# Altium schematic symbol library Regulator_Linear.SchLib: 1452 symbols (part 5 of 10)
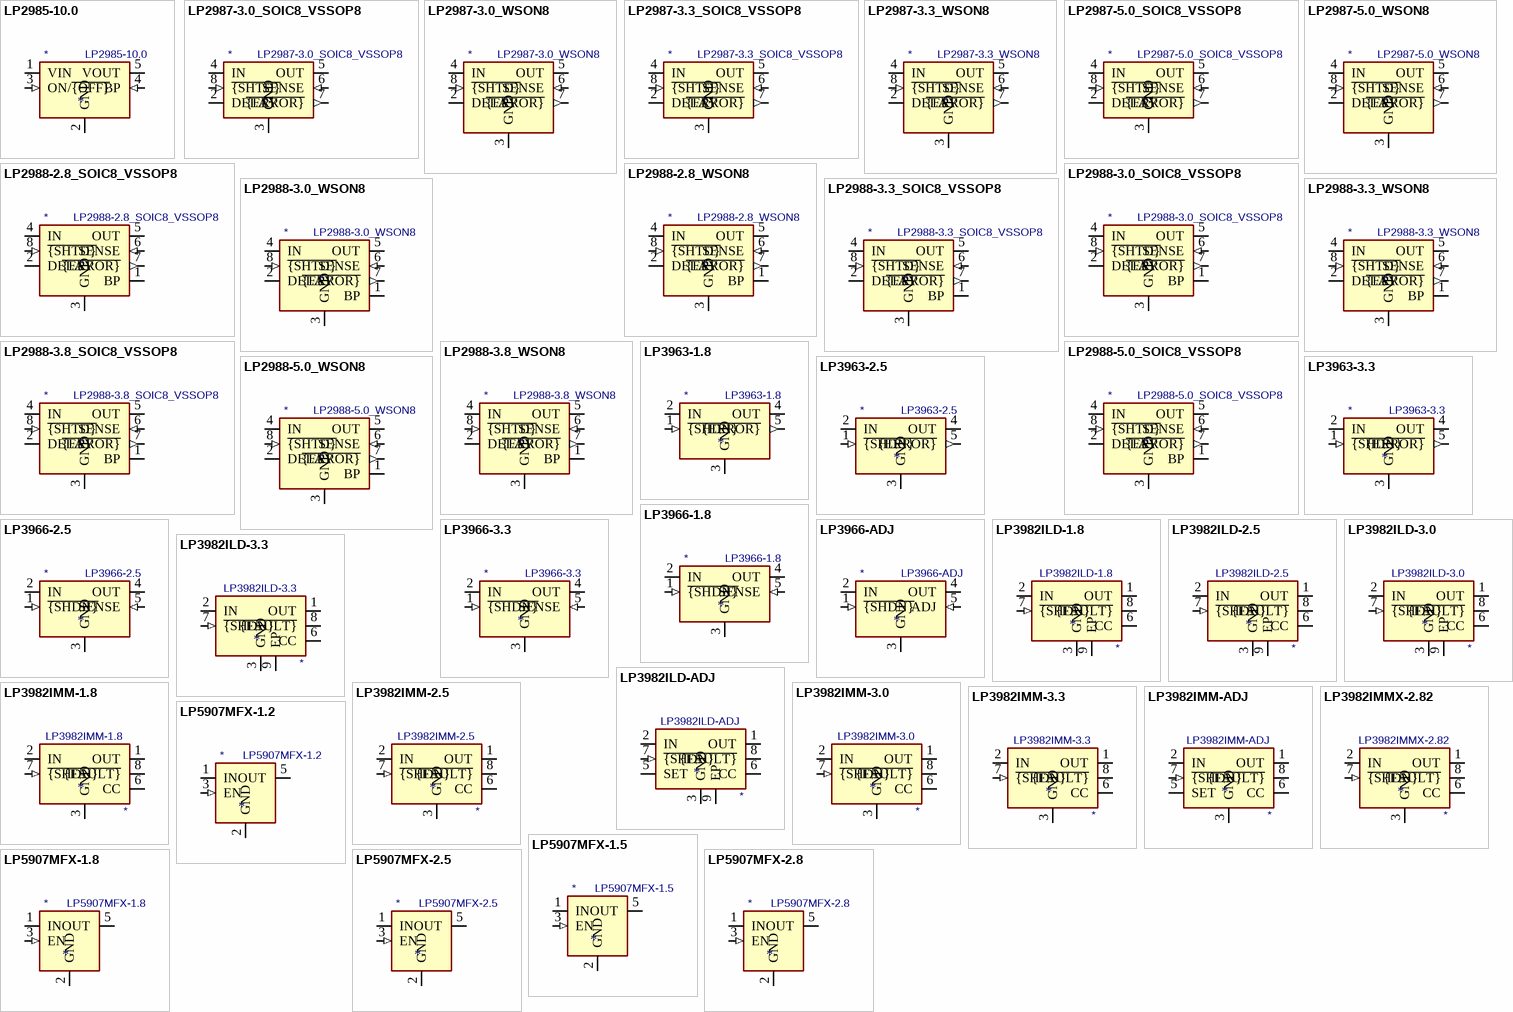
[diagram p40: symbols LP2985-10.0 to LP5907MFX-2.8]

## LP3982IMM-1.8
designator *  value LP3982IMM-1.8
ki_keywords: linear regulator; ki_description: 1.8V, 300mA, Micropower, Ultra-Low-Dropout, Low-Noise CMOS Regulator, VSSOP-8; ki_fp_filters: VSSOP*3.0x3.0mm*P0.65mm*; Footprint: Package_SO:VSSOP-8_3.0x3.0mm_P0.65mm; Supplier: http://www.ti.com/lit/ds/symlink/lp3982.pdf
footprint VSSOP-8_3.0x3.0mm_P0.65mm
pins: 1 OUT (power), 2 IN (power), 3 GND (power), 4 OUT hidden, 5 NC (in) hidden, 6 CC, 7 ~{{SHDN}} (in), 8 ~{{FAULT}} (oc)

## LP3982IMM-2.5
designator *  value LP3982IMM-2.5
ki_keywords: linear regulator; ki_description: 2.5V, 300mA, Micropower, Ultra-Low-Dropout, Low-Noise CMOS Regulator, VSSOP-8; ki_fp_filters: VSSOP*3.0x3.0mm*P0.65mm*; Footprint: Package_SO:VSSOP-8_3.0x3.0mm_P0.65mm; Supplier: http://www.ti.com/lit/ds/symlink/lp3982.pdf
footprint VSSOP-8_3.0x3.0mm_P0.65mm
pins: 1 OUT (power), 2 IN (power), 3 GND (power), 4 OUT hidden, 5 NC (in) hidden, 6 CC, 7 ~{{SHDN}} (in), 8 ~{{FAULT}} (oc)

## LP3982IMM-3.0
designator *  value LP3982IMM-3.0
ki_keywords: linear regulator; ki_description: 3.0V, 300mA, Micropower, Ultra-Low-Dropout, Low-Noise CMOS Regulator, VSSOP-8; ki_fp_filters: VSSOP*3.0x3.0mm*P0.65mm*; Footprint: Package_SO:VSSOP-8_3.0x3.0mm_P0.65mm; Supplier: http://www.ti.com/lit/ds/symlink/lp3982.pdf
footprint VSSOP-8_3.0x3.0mm_P0.65mm
pins: 1 OUT (power), 2 IN (power), 3 GND (power), 4 OUT hidden, 5 NC (in) hidden, 6 CC, 7 ~{{SHDN}} (in), 8 ~{{FAULT}} (oc)

## LP3982IMM-3.3
designator *  value LP3982IMM-3.3
ki_keywords: linear regulator; ki_description: 3.3V, 300mA, Micropower, Ultra-Low-Dropout, Low-Noise CMOS Regulator, VSSOP-8; ki_fp_filters: VSSOP*3.0x3.0mm*P0.65mm*; Footprint: Package_SO:VSSOP-8_3.0x3.0mm_P0.65mm; Supplier: http://www.ti.com/lit/ds/symlink/lp3982.pdf
footprint VSSOP-8_3.0x3.0mm_P0.65mm
pins: 1 OUT (power), 2 IN (power), 3 GND (power), 4 OUT hidden, 5 NC (in) hidden, 6 CC, 7 ~{{SHDN}} (in), 8 ~{{FAULT}} (oc)

## LP3982IMM-ADJ
designator *  value LP3982IMM-ADJ
ki_keywords: adjustable linear regulator; ki_description: 300mA, Micropower, Ultra-Low-Dropout, Low-Noise Adjustable CMOS Regulator, VSSOP-8; ki_fp_filters: VSSOP*3.0x3.0mm*P0.65mm*; Footprint: Package_SO:VSSOP-8_3.0x3.0mm_P0.65mm; Supplier: http://www.ti.com/lit/ds/symlink/lp3982.pdf
footprint VSSOP-8_3.0x3.0mm_P0.65mm
pins: 1 OUT (power), 2 IN (power), 3 GND (power), 4 OUT hidden, 5 SET, 6 CC, 7 ~{{SHDN}} (in), 8 ~{{FAULT}} (oc)

## LP3982IMMX-2.82
designator *  value LP3982IMMX-2.82
ki_keywords: linear regulator; ki_description: 2.82V, 300mA, Micropower, Ultra-Low-Dropout, Low-Noise CMOS Regulator, VSSOP-8; ki_fp_filters: VSSOP*3.0x3.0mm*P0.65mm*; Footprint: Package_SO:VSSOP-8_3.0x3.0mm_P0.65mm; Supplier: http://www.ti.com/lit/ds/symlink/lp3982.pdf
footprint VSSOP-8_3.0x3.0mm_P0.65mm
pins: 1 OUT (power), 2 IN (power), 3 GND (power), 4 OUT hidden, 5 NC (in) hidden, 6 CC, 7 ~{{SHDN}} (in), 8 ~{{FAULT}} (oc)

## LP5907MFX-1.2
designator *  value LP5907MFX-1.2
ki_keywords: Single Output LDO Low-Noise; ki_description: 250-mA Ultra-Low-Noise Low-IQ LDO, 1.2V, SOT-23; ki_fp_filters: SOT?23*; Footprint: Package_TO_SOT_SMD:SOT-23-5; Supplier: http://www.ti.com/lit/ds/symlink/lp5907.pdf
footprint SOT-23-5
pins: 1 IN (power), 2 GND (power), 3 EN (in), 4 NC (in) hidden, 5 OUT (power)

## LP5907MFX-1.5
designator *  value LP5907MFX-1.5
ki_keywords: Single Output LDO Low-Noise; ki_description: 250-mA Ultra-Low-Noise Low-IQ LDO, 1.5V, SOT-23; ki_fp_filters: SOT?23*; Footprint: Package_TO_SOT_SMD:SOT-23-5; Supplier: http://www.ti.com/lit/ds/symlink/lp5907.pdf
footprint SOT-23-5
pins: 1 IN (power), 2 GND (power), 3 EN (in), 4 NC (in) hidden, 5 OUT (power)

## LP5907MFX-1.8
designator *  value LP5907MFX-1.8
ki_keywords: Single Output LDO Low-Noise; ki_description: 250-mA Ultra-Low-Noise Low-IQ LDO, 1.8V, SOT-23; ki_fp_filters: SOT?23*; Footprint: Package_TO_SOT_SMD:SOT-23-5; Supplier: http://www.ti.com/lit/ds/symlink/lp5907.pdf
footprint SOT-23-5
pins: 1 IN (power), 2 GND (power), 3 EN (in), 4 NC (in) hidden, 5 OUT (power)

## LP5907MFX-2.5
designator *  value LP5907MFX-2.5
ki_keywords: Single Output LDO Low-Noise; ki_description: 250-mA Ultra-Low-Noise Low-IQ LDO, 2.5V, SOT-23; ki_fp_filters: SOT?23*; Footprint: Package_TO_SOT_SMD:SOT-23-5; Supplier: http://www.ti.com/lit/ds/symlink/lp5907.pdf
footprint SOT-23-5
pins: 1 IN (power), 2 GND (power), 3 EN (in), 4 NC (in) hidden, 5 OUT (power)

## LP5907MFX-2.8
designator *  value LP5907MFX-2.8
ki_keywords: Single Output LDO Low-Noise; ki_description: 250-mA Ultra-Low-Noise Low-IQ LDO, 2.8V, SOT-23; ki_fp_filters: SOT?23*; Footprint: Package_TO_SOT_SMD:SOT-23-5; Supplier: http://www.ti.com/lit/ds/symlink/lp5907.pdf
footprint SOT-23-5
pins: 1 IN (power), 2 GND (power), 3 EN (in), 4 NC (in) hidden, 5 OUT (power)

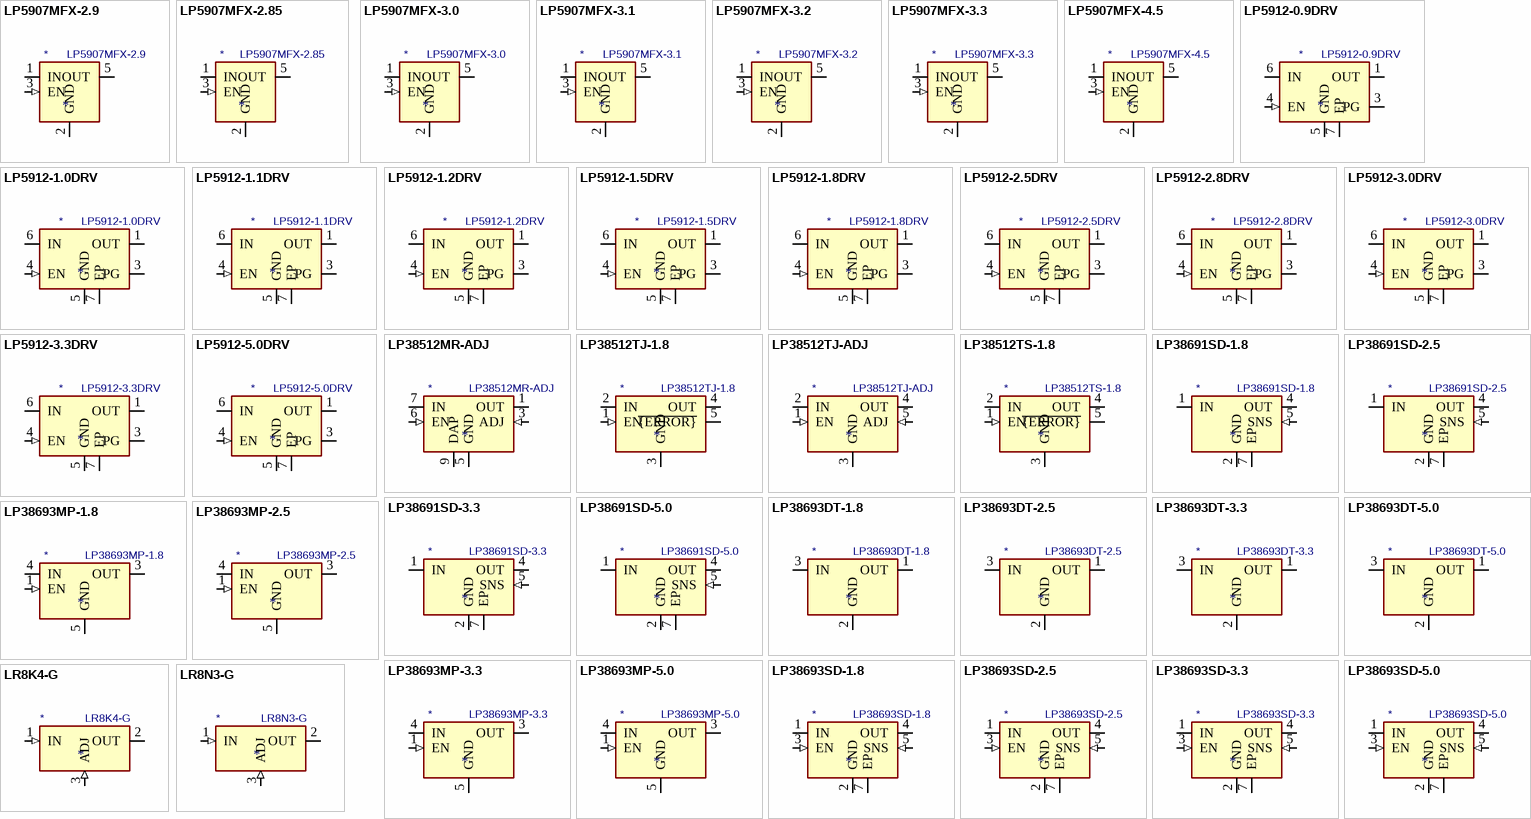
[diagram p16: symbols LP5907MFX-2.9 to LR8N3-G]

## LP5907MFX-2.9
designator *  value LP5907MFX-2.9
ki_keywords: Single Output LDO Low-Noise; ki_description: 250-mA Ultra-Low-Noise Low-IQ LDO, 2.9V, SOT-23; ki_fp_filters: SOT?23*; Footprint: Package_TO_SOT_SMD:SOT-23-5; Supplier: http://www.ti.com/lit/ds/symlink/lp5907.pdf
footprint SOT-23-5
pins: 1 IN (power), 2 GND (power), 3 EN (in), 4 NC (in) hidden, 5 OUT (power)

## LP5907MFX-2.85
designator *  value LP5907MFX-2.85
ki_keywords: Single Output LDO Low-Noise; ki_description: 250-mA Ultra-Low-Noise Low-IQ LDO, 2.85V, SOT-23; ki_fp_filters: SOT?23*; Footprint: Package_TO_SOT_SMD:SOT-23-5; Supplier: http://www.ti.com/lit/ds/symlink/lp5907.pdf
footprint SOT-23-5
pins: 1 IN (power), 2 GND (power), 3 EN (in), 4 NC (in) hidden, 5 OUT (power)

## LP5907MFX-3.0
designator *  value LP5907MFX-3.0
ki_keywords: Single Output LDO Low-Noise; ki_description: 250-mA Ultra-Low-Noise Low-IQ LDO, 3.0V, SOT-23; ki_fp_filters: SOT?23*; Footprint: Package_TO_SOT_SMD:SOT-23-5; Supplier: http://www.ti.com/lit/ds/symlink/lp5907.pdf
footprint SOT-23-5
pins: 1 IN (power), 2 GND (power), 3 EN (in), 4 NC (in) hidden, 5 OUT (power)

## LP5907MFX-3.1
designator *  value LP5907MFX-3.1
ki_keywords: Single Output LDO Low-Noise; ki_description: 250-mA Ultra-Low-Noise Low-IQ LDO, 3.1V, SOT-23; ki_fp_filters: SOT?23*; Footprint: Package_TO_SOT_SMD:SOT-23-5; Supplier: http://www.ti.com/lit/ds/symlink/lp5907.pdf
footprint SOT-23-5
pins: 1 IN (power), 2 GND (power), 3 EN (in), 4 NC (in) hidden, 5 OUT (power)

## LP5907MFX-3.2
designator *  value LP5907MFX-3.2
ki_keywords: Single Output LDO Low-Noise; ki_description: 250-mA Ultra-Low-Noise Low-IQ LDO, 3.2V, SOT-23; ki_fp_filters: SOT?23*; Footprint: Package_TO_SOT_SMD:SOT-23-5; Supplier: http://www.ti.com/lit/ds/symlink/lp5907.pdf
footprint SOT-23-5
pins: 1 IN (power), 2 GND (power), 3 EN (in), 4 NC (in) hidden, 5 OUT (power)

## LP5907MFX-3.3
designator *  value LP5907MFX-3.3
ki_keywords: Single Output LDO Low-Noise; ki_description: 250-mA Ultra-Low-Noise Low-IQ LDO, 3.3V, SOT-23; ki_fp_filters: SOT?23*; Footprint: Package_TO_SOT_SMD:SOT-23-5; Supplier: http://www.ti.com/lit/ds/symlink/lp5907.pdf
footprint SOT-23-5
pins: 1 IN (power), 2 GND (power), 3 EN (in), 4 NC (in) hidden, 5 OUT (power)

## LP5907MFX-4.5
designator *  value LP5907MFX-4.5
ki_keywords: Single Output LDO Low-Noise; ki_description: 250-mA Ultra-Low-Noise Low-IQ LDO, 4.5V, SOT-23; ki_fp_filters: SOT?23*; Footprint: Package_TO_SOT_SMD:SOT-23-5; Supplier: http://www.ti.com/lit/ds/symlink/lp5907.pdf
footprint SOT-23-5
pins: 1 IN (power), 2 GND (power), 3 EN (in), 4 NC (in) hidden, 5 OUT (power)

## LP5912-0.9DRV
designator *  value LP5912-0.9DRV
ki_keywords: Single Output LDO Low-Noise; ki_description: 500-mA Ultra-Low-Noise Low-IQ LDO, 0.9V, WSON-6; ki_fp_filters: WSON*1EP*2x2mm*P0.65mm*; Footprint: Package_SON:WSON-6-1EP_2x2mm_P0.65mm_EP1x1.6mm_ThermalVias; Supplier: http://www.ti.com/lit/ds/symlink/lp5912.pdf
footprint WSON-6-1EP_2x2mm_P0.65mm_EP1x1.6mm_ThermalVias
pins: 1 OUT (power), 2 NC (in) hidden, 3 PG (oc), 4 EN (in), 5 GND (power), 6 IN (power), 7 EP

## LP5912-1.0DRV
designator *  value LP5912-1.0DRV
ki_keywords: Single Output LDO Low-Noise; ki_description: 500-mA Ultra-Low-Noise Low-IQ LDO, 1.0V, WSON-6; ki_fp_filters: WSON*1EP*2x2mm*P0.65mm*; Footprint: Package_SON:WSON-6-1EP_2x2mm_P0.65mm_EP1x1.6mm_ThermalVias; Supplier: http://www.ti.com/lit/ds/symlink/lp5912.pdf
footprint WSON-6-1EP_2x2mm_P0.65mm_EP1x1.6mm_ThermalVias
pins: 1 OUT (power), 2 NC (in) hidden, 3 PG (oc), 4 EN (in), 5 GND (power), 6 IN (power), 7 EP

## LP5912-1.1DRV
designator *  value LP5912-1.1DRV
ki_keywords: Single Output LDO Low-Noise; ki_description: 500-mA Ultra-Low-Noise Low-IQ LDO, 1.1V, WSON-6; ki_fp_filters: WSON*1EP*2x2mm*P0.65mm*; Footprint: Package_SON:WSON-6-1EP_2x2mm_P0.65mm_EP1x1.6mm_ThermalVias; Supplier: http://www.ti.com/lit/ds/symlink/lp5912.pdf
footprint WSON-6-1EP_2x2mm_P0.65mm_EP1x1.6mm_ThermalVias
pins: 1 OUT (power), 2 NC (in) hidden, 3 PG (oc), 4 EN (in), 5 GND (power), 6 IN (power), 7 EP

## LP5912-1.2DRV
designator *  value LP5912-1.2DRV
ki_keywords: Single Output LDO Low-Noise; ki_description: 500-mA Ultra-Low-Noise Low-IQ LDO, 1.2V, WSON-6; ki_fp_filters: WSON*1EP*2x2mm*P0.65mm*; Footprint: Package_SON:WSON-6-1EP_2x2mm_P0.65mm_EP1x1.6mm_ThermalVias; Supplier: http://www.ti.com/lit/ds/symlink/lp5912.pdf
footprint WSON-6-1EP_2x2mm_P0.65mm_EP1x1.6mm_ThermalVias
pins: 1 OUT (power), 2 NC (in) hidden, 3 PG (oc), 4 EN (in), 5 GND (power), 6 IN (power), 7 EP

## LP5912-1.5DRV
designator *  value LP5912-1.5DRV
ki_keywords: Single Output LDO Low-Noise; ki_description: 500-mA Ultra-Low-Noise Low-IQ LDO, 1.5V, WSON-6; ki_fp_filters: WSON*1EP*2x2mm*P0.65mm*; Footprint: Package_SON:WSON-6-1EP_2x2mm_P0.65mm_EP1x1.6mm_ThermalVias; Supplier: http://www.ti.com/lit/ds/symlink/lp5912.pdf
footprint WSON-6-1EP_2x2mm_P0.65mm_EP1x1.6mm_ThermalVias
pins: 1 OUT (power), 2 NC (in) hidden, 3 PG (oc), 4 EN (in), 5 GND (power), 6 IN (power), 7 EP

## LP5912-1.8DRV
designator *  value LP5912-1.8DRV
ki_keywords: Single Output LDO Low-Noise; ki_description: 500-mA Ultra-Low-Noise Low-IQ LDO, 1.8V, WSON-6; ki_fp_filters: WSON*1EP*2x2mm*P0.65mm*; Footprint: Package_SON:WSON-6-1EP_2x2mm_P0.65mm_EP1x1.6mm_ThermalVias; Supplier: http://www.ti.com/lit/ds/symlink/lp5912.pdf
footprint WSON-6-1EP_2x2mm_P0.65mm_EP1x1.6mm_ThermalVias
pins: 1 OUT (power), 2 NC (in) hidden, 3 PG (oc), 4 EN (in), 5 GND (power), 6 IN (power), 7 EP

## LP5912-2.5DRV
designator *  value LP5912-2.5DRV
ki_keywords: Single Output LDO Low-Noise; ki_description: 500-mA Ultra-Low-Noise Low-IQ LDO, 2.5V, WSON-6; ki_fp_filters: WSON*1EP*2x2mm*P0.65mm*; Footprint: Package_SON:WSON-6-1EP_2x2mm_P0.65mm_EP1x1.6mm_ThermalVias; Supplier: http://www.ti.com/lit/ds/symlink/lp5912.pdf
footprint WSON-6-1EP_2x2mm_P0.65mm_EP1x1.6mm_ThermalVias
pins: 1 OUT (power), 2 NC (in) hidden, 3 PG (oc), 4 EN (in), 5 GND (power), 6 IN (power), 7 EP

## LP5912-2.8DRV
designator *  value LP5912-2.8DRV
ki_keywords: Single Output LDO Low-Noise; ki_description: 500-mA Ultra-Low-Noise Low-IQ LDO, 2.8V, WSON-6; ki_fp_filters: WSON*1EP*2x2mm*P0.65mm*; Footprint: Package_SON:WSON-6-1EP_2x2mm_P0.65mm_EP1x1.6mm_ThermalVias; Supplier: http://www.ti.com/lit/ds/symlink/lp5912.pdf
footprint WSON-6-1EP_2x2mm_P0.65mm_EP1x1.6mm_ThermalVias
pins: 1 OUT (power), 2 NC (in) hidden, 3 PG (oc), 4 EN (in), 5 GND (power), 6 IN (power), 7 EP

## LP5912-3.0DRV
designator *  value LP5912-3.0DRV
ki_keywords: Single Output LDO Low-Noise; ki_description: 500-mA Ultra-Low-Noise Low-IQ LDO, 3.0V, WSON-6; ki_fp_filters: WSON*1EP*2x2mm*P0.65mm*; Footprint: Package_SON:WSON-6-1EP_2x2mm_P0.65mm_EP1x1.6mm_ThermalVias; Supplier: http://www.ti.com/lit/ds/symlink/lp5912.pdf
footprint WSON-6-1EP_2x2mm_P0.65mm_EP1x1.6mm_ThermalVias
pins: 1 OUT (power), 2 NC (in) hidden, 3 PG (oc), 4 EN (in), 5 GND (power), 6 IN (power), 7 EP

## LP5912-3.3DRV
designator *  value LP5912-3.3DRV
ki_keywords: Single Output LDO Low-Noise; ki_description: 500-mA Ultra-Low-Noise Low-IQ LDO, 3.3V, WSON-6; ki_fp_filters: WSON*1EP*2x2mm*P0.65mm*; Footprint: Package_SON:WSON-6-1EP_2x2mm_P0.65mm_EP1x1.6mm_ThermalVias; Supplier: http://www.ti.com/lit/ds/symlink/lp5912.pdf
footprint WSON-6-1EP_2x2mm_P0.65mm_EP1x1.6mm_ThermalVias
pins: 1 OUT (power), 2 NC (in) hidden, 3 PG (oc), 4 EN (in), 5 GND (power), 6 IN (power), 7 EP

## LP5912-5.0DRV
designator *  value LP5912-5.0DRV
ki_keywords: Single Output LDO Low-Noise; ki_description: 500-mA Ultra-Low-Noise Low-IQ LDO, 5.0V, WSON-6; ki_fp_filters: WSON*1EP*2x2mm*P0.65mm*; Footprint: Package_SON:WSON-6-1EP_2x2mm_P0.65mm_EP1x1.6mm_ThermalVias; Supplier: http://www.ti.com/lit/ds/symlink/lp5912.pdf
footprint WSON-6-1EP_2x2mm_P0.65mm_EP1x1.6mm_ThermalVias
pins: 1 OUT (power), 2 NC (in) hidden, 3 PG (oc), 4 EN (in), 5 GND (power), 6 IN (power), 7 EP

## LP38512MR-ADJ
designator *  value LP38512MR-ADJ
ki_keywords: LDO Linear Regulator; ki_description: 1.5A Fast-Transient Response Low-Dropout Linear Voltage Regulator with Error Flag, Adjustable Output, HTSOP-8; ki_fp_filters: Texas*HTSOP*1EP*3.9x4.9mm*P1.27mm*; Footprint: Package_SO:Texas_HTSOP-8-1EP_3.9x4.9mm_P1.27mm_EP2.95x4.9mm_Mask2.4x3.1mm_ThermalVias; Supplier: http://www.ti.com/lit/ds/symlink/lp38512-adj.pdf
footprint Texas_HTSOP-8-1EP_3.9x4.9mm_P1.27mm_EP2.95x4.9mm_Mask2.4x3.1mm_ThermalVias
pins: 1 OUT (power), 2 OUT hidden, 3 ADJ (in), 4 NC (in) hidden, 5 GND (power), 6 EN (in), 7 IN (power), 8 IN hidden, 9 DAP

## LP38512TJ-1.8
designator *  value LP38512TJ-1.8
ki_keywords: LDO Linear Regulator; ki_description: 1.5A Fast-Transient Response Low-Dropout Linear Voltage Regulator with Error Flag, 1.8V Output, NDQ; ki_fp_filters: Texas*NDQ*; Footprint: Package_TO_SOT_SMD:Texas_NDQ; Supplier: http://www.ti.com/lit/ds/symlink/lp38512.pdf
footprint Texas_NDQ
pins: 1 EN (in), 2 IN (power), 3 GND (power), 4 OUT (power), 5 ~{{ERROR}} (oc), 6 GND hidden

## LP38512TJ-ADJ
designator *  value LP38512TJ-ADJ
ki_keywords: LDO Linear Regulator; ki_description: 1.5A Fast-Transient Response Low-Dropout Linear Voltage Regulator with Error Flag, Adjustable Output, NDQ; ki_fp_filters: Texas*NDQ*; Footprint: Package_TO_SOT_SMD:Texas_NDQ; Supplier: http://www.ti.com/lit/ds/symlink/lp38512-adj.pdf
footprint Texas_NDQ
pins: 1 EN (in), 2 IN (power), 3 GND (power), 4 OUT (power), 5 ADJ (in), 6 GND hidden

## LP38512TS-1.8
designator *  value LP38512TS-1.8
ki_keywords: LDO Linear Regulator DDPAK D2PAK; ki_description: 1.5A Fast-Transient Response Low-Dropout Linear Voltage Regulator with Error Flag, 1.8V Output, TO-263; ki_fp_filters: TO*263*TabPin6*; Footprint: Package_TO_SOT_SMD:TO-263-5_TabPin6; Supplier: http://www.ti.com/lit/ds/symlink/lp38512.pdf
footprint TO-263-5_TabPin6
pins: 1 EN (in), 2 IN (power), 3 GND (power), 4 OUT (power), 5 ~{{ERROR}} (oc), 6 GND hidden

## LP38691SD-1.8
designator *  value LP38691SD-1.8
ki_keywords: LDO Linear Regulator; ki_description: 500-mA Low-Dropout CMOS Linear Regulators Stable With Ceramic Output Capacitors, 1.8V output voltage, WSON-6; ki_fp_filters: WSON*1EP*3x3mm*P0.95mm*; Footprint: Package_SON:WSON-6-1EP_3x3mm_P0.95mm; Supplier: https://www.ti.com/lit/ds/symlink/lp38691.pdf
footprint WSON-6-1EP_3x3mm_P0.95mm
pins: 1 IN (power), 2 GND (power), 3 NC (in) hidden, 4 OUT (power), 5 SNS (in), 6 IN hidden, 7 EP

## LP38691SD-2.5
designator *  value LP38691SD-2.5
ki_keywords: LDO Linear Regulator; ki_description: 500-mA Low-Dropout CMOS Linear Regulators Stable With Ceramic Output Capacitors, 2.5V output voltage, WSON-6; ki_fp_filters: WSON*1EP*3x3mm*P0.95mm*; Footprint: Package_SON:WSON-6-1EP_3x3mm_P0.95mm; Supplier: https://www.ti.com/lit/ds/symlink/lp38691.pdf
footprint WSON-6-1EP_3x3mm_P0.95mm
pins: 1 IN (power), 2 GND (power), 3 NC (in) hidden, 4 OUT (power), 5 SNS (in), 6 IN hidden, 7 EP

## LP38691SD-3.3
designator *  value LP38691SD-3.3
ki_keywords: LDO Linear Regulator; ki_description: 500-mA Low-Dropout CMOS Linear Regulators Stable With Ceramic Output Capacitors, 3.3V output voltage, WSON-6; ki_fp_filters: WSON*1EP*3x3mm*P0.95mm*; Footprint: Package_SON:WSON-6-1EP_3x3mm_P0.95mm; Supplier: https://www.ti.com/lit/ds/symlink/lp38691.pdf
footprint WSON-6-1EP_3x3mm_P0.95mm
pins: 1 IN (power), 2 GND (power), 3 NC (in) hidden, 4 OUT (power), 5 SNS (in), 6 IN hidden, 7 EP

## LP38691SD-5.0
designator *  value LP38691SD-5.0
ki_keywords: LDO Linear Regulator; ki_description: 500-mA Low-Dropout CMOS Linear Regulators Stable With Ceramic Output Capacitors, 5.0V output voltage, WSON-6; ki_fp_filters: WSON*1EP*3x3mm*P0.95mm*; Footprint: Package_SON:WSON-6-1EP_3x3mm_P0.95mm; Supplier: https://www.ti.com/lit/ds/symlink/lp38691.pdf
footprint WSON-6-1EP_3x3mm_P0.95mm
pins: 1 IN (power), 2 GND (power), 3 NC (in) hidden, 4 OUT (power), 5 SNS (in), 6 IN hidden, 7 EP

## LP38693DT-1.8
designator *  value LP38693DT-1.8
ki_keywords: LDO Linear Regulator; ki_description: 500-mA Low-Dropout CMOS Linear Regulators Stable With Ceramic Output Capacitors, 1.8V output voltage, TO-252; ki_fp_filters: TO*252*; Footprint: Package_TO_SOT_SMD:TO-252-2; Supplier: https://www.ti.com/lit/ds/symlink/lp38693.pdf
footprint TO-252-2
pins: 1 OUT (power), 2 GND (power), 3 IN (power)

## LP38693DT-2.5
designator *  value LP38693DT-2.5
ki_keywords: LDO Linear Regulator; ki_description: 500-mA Low-Dropout CMOS Linear Regulators Stable With Ceramic Output Capacitors, 2.5V output voltage, TO-252; ki_fp_filters: TO*252*; Footprint: Package_TO_SOT_SMD:TO-252-2; Supplier: https://www.ti.com/lit/ds/symlink/lp38693.pdf
footprint TO-252-2
pins: 1 OUT (power), 2 GND (power), 3 IN (power)

## LP38693DT-3.3
designator *  value LP38693DT-3.3
ki_keywords: LDO Linear Regulator; ki_description: 500-mA Low-Dropout CMOS Linear Regulators Stable With Ceramic Output Capacitors, 3.3V output voltage, TO-252; ki_fp_filters: TO*252*; Footprint: Package_TO_SOT_SMD:TO-252-2; Supplier: https://www.ti.com/lit/ds/symlink/lp38693.pdf
footprint TO-252-2
pins: 1 OUT (power), 2 GND (power), 3 IN (power)

## LP38693DT-5.0
designator *  value LP38693DT-5.0
ki_keywords: LDO Linear Regulator; ki_description: 500-mA Low-Dropout CMOS Linear Regulators Stable With Ceramic Output Capacitors, 5.0V output voltage, TO-252; ki_fp_filters: TO*252*; Footprint: Package_TO_SOT_SMD:TO-252-2; Supplier: https://www.ti.com/lit/ds/symlink/lp38693.pdf
footprint TO-252-2
pins: 1 OUT (power), 2 GND (power), 3 IN (power)

## LP38693MP-1.8
designator *  value LP38693MP-1.8
ki_keywords: LDO Linear Regulator; ki_description: 500-mA Low-Dropout CMOS Linear Regulators Stable With Ceramic Output Capacitors, 1.8V output voltage, Enable Pin, SOT-223; ki_fp_filters: SOT*223*; Footprint: Package_TO_SOT_SMD:SOT-223-5; Supplier: https://www.ti.com/lit/ds/symlink/lp38693.pdf
footprint SOT-223-5
pins: 1 EN (in), 2 NC (in) hidden, 3 OUT (power), 4 IN (power), 5 GND (power)

## LP38693MP-2.5
designator *  value LP38693MP-2.5
ki_keywords: LDO Linear Regulator; ki_description: 500-mA Low-Dropout CMOS Linear Regulators Stable With Ceramic Output Capacitors, 2.5V output voltage, Enable Pin, SOT-223; ki_fp_filters: SOT*223*; Footprint: Package_TO_SOT_SMD:SOT-223-5; Supplier: https://www.ti.com/lit/ds/symlink/lp38693.pdf
footprint SOT-223-5
pins: 1 EN (in), 2 NC (in) hidden, 3 OUT (power), 4 IN (power), 5 GND (power)

## LP38693MP-3.3
designator *  value LP38693MP-3.3
ki_keywords: LDO Linear Regulator; ki_description: 500-mA Low-Dropout CMOS Linear Regulators Stable With Ceramic Output Capacitors, 3.3V output voltage, Enable Pin, SOT-223; ki_fp_filters: SOT*223*; Footprint: Package_TO_SOT_SMD:SOT-223-5; Supplier: https://www.ti.com/lit/ds/symlink/lp38693.pdf
footprint SOT-223-5
pins: 1 EN (in), 2 NC (in) hidden, 3 OUT (power), 4 IN (power), 5 GND (power)

## LP38693MP-5.0
designator *  value LP38693MP-5.0
ki_keywords: LDO Linear Regulator; ki_description: 500-mA Low-Dropout CMOS Linear Regulators Stable With Ceramic Output Capacitors, 5.0V output voltage, Enable Pin, SOT-223; ki_fp_filters: SOT*223*; Footprint: Package_TO_SOT_SMD:SOT-223-5; Supplier: https://www.ti.com/lit/ds/symlink/lp38693.pdf
footprint SOT-223-5
pins: 1 EN (in), 2 NC (in) hidden, 3 OUT (power), 4 IN (power), 5 GND (power)

## LP38693SD-1.8
designator *  value LP38693SD-1.8
ki_keywords: LDO Linear Regulator; ki_description: 500-mA Low-Dropout CMOS Linear Regulators Stable With Ceramic Output Capacitors, 1.8V output voltage, Enable Pin, WSON-6; ki_fp_filters: WSON*1EP*3x3mm*P0.95mm*; Footprint: Package_SON:WSON-6-1EP_3x3mm_P0.95mm; Supplier: https://www.ti.com/lit/ds/symlink/lp38693.pdf
footprint WSON-6-1EP_3x3mm_P0.95mm
pins: 1 IN (power), 2 GND (power), 3 EN (in), 4 OUT (power), 5 SNS (in), 6 IN hidden, 7 EP

## LP38693SD-2.5
designator *  value LP38693SD-2.5
ki_keywords: LDO Linear Regulator; ki_description: 500-mA Low-Dropout CMOS Linear Regulators Stable With Ceramic Output Capacitors, 2.5V output voltage, Enable Pin, WSON-6; ki_fp_filters: WSON*1EP*3x3mm*P0.95mm*; Footprint: Package_SON:WSON-6-1EP_3x3mm_P0.95mm; Supplier: https://www.ti.com/lit/ds/symlink/lp38693.pdf
footprint WSON-6-1EP_3x3mm_P0.95mm
pins: 1 IN (power), 2 GND (power), 3 EN (in), 4 OUT (power), 5 SNS (in), 6 IN hidden, 7 EP

## LP38693SD-3.3
designator *  value LP38693SD-3.3
ki_keywords: LDO Linear Regulator; ki_description: 500-mA Low-Dropout CMOS Linear Regulators Stable With Ceramic Output Capacitors, 3.3V output voltage, Enable Pin, WSON-6; ki_fp_filters: WSON*1EP*3x3mm*P0.95mm*; Footprint: Package_SON:WSON-6-1EP_3x3mm_P0.95mm; Supplier: https://www.ti.com/lit/ds/symlink/lp38693.pdf
footprint WSON-6-1EP_3x3mm_P0.95mm
pins: 1 IN (power), 2 GND (power), 3 EN (in), 4 OUT (power), 5 SNS (in), 6 IN hidden, 7 EP

## LP38693SD-5.0
designator *  value LP38693SD-5.0
ki_keywords: LDO Linear Regulator; ki_description: 500-mA Low-Dropout CMOS Linear Regulators Stable With Ceramic Output Capacitors, 5.0V output voltage, Enable Pin, WSON-6; ki_fp_filters: WSON*1EP*3x3mm*P0.95mm*; Footprint: Package_SON:WSON-6-1EP_3x3mm_P0.95mm; Supplier: https://www.ti.com/lit/ds/symlink/lp38693.pdf
footprint WSON-6-1EP_3x3mm_P0.95mm
pins: 1 IN (power), 2 GND (power), 3 EN (in), 4 OUT (power), 5 SNS (in), 6 IN hidden, 7 EP

## LR8K4-G
designator *  value LR8K4-G
ki_keywords: High-Voltage Regulator Adjustable Positive; ki_description: 30mA 450V High-Voltage Linear Regulator (Adjustable), TO-252 (D-PAK); ki_fp_filters: TO*252*; Footprint: Package_TO_SOT_SMD:TO-252-2; Supplier: http://ww1.microchip.com/downloads/en/DeviceDoc/20005399B.pdf
footprint TO-252-2
pins: 1 IN (in), 2 OUT (power), 3 ADJ (in)

## LR8N3-G
designator *  value LR8N3-G
ki_keywords: High-Voltage Regulator Adjustable Positive; ki_description: 30mA 450V High-Voltage Linear Regulator (Adjustable), TO-92; ki_fp_filters: TO?92*; Footprint: Package_TO_SOT_THT:TO-92_Inline; Supplier: http://www.supertex.com/pdf/datasheets/LR8.pdf
footprint TO-92_Inline
pins: 1 IN (in), 2 OUT (power), 3 ADJ (in)

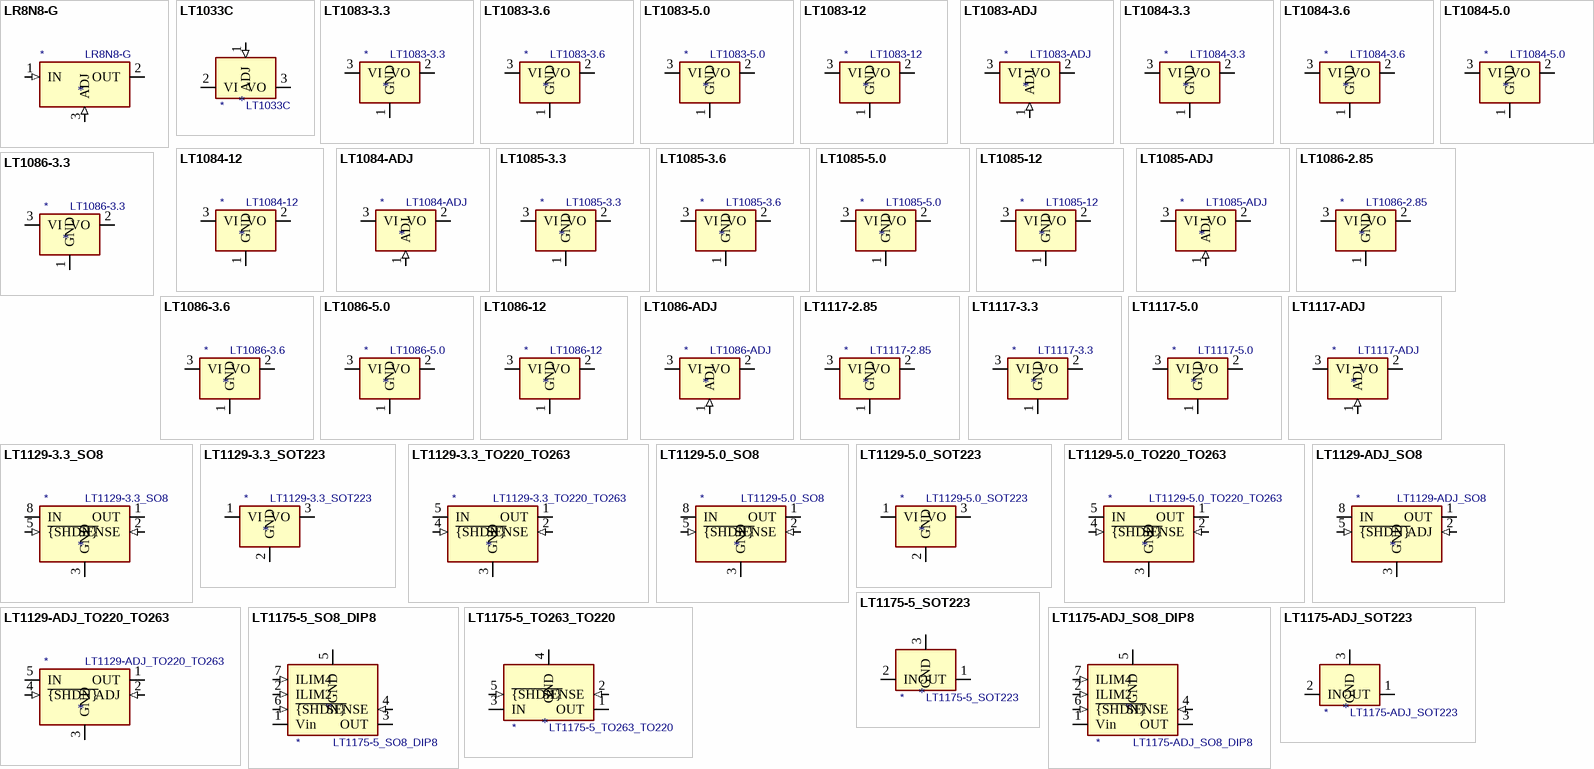
[diagram p17: symbols LR8N8-G to LT1175-ADJ_SOT223]

## LR8N8-G
designator *  value LR8N8-G
ki_keywords: High-Voltage Regulator Adjustable Positive; ki_description: 30mA 450V High-Voltage Linear Regulator (Adjustable), SOT-89; ki_fp_filters: SOT*; Footprint: Package_TO_SOT_SMD:SOT-89-3; Supplier: http://www.supertex.com/pdf/datasheets/LR8.pdf
footprint SOT-89-3
pins: 1 IN (in), 2 OUT (power), 3 ADJ (in)

## LT1033C
designator *  value LT1033C
ki_keywords: Adjustable Voltage Regulator 3A Negative; ki_description: Negative 3A 35V Adjustable Linear Regulator, TO-220; ki_fp_filters: TO?220*; Footprint: Package_TO_SOT_THT:TO-220-3_Vertical; Supplier: https://www.analog.com/media/en/technical-documentation/data-sheets/1033fd.pdf
footprint TO-220-3_Vertical
pins: 1 ADJ (in), 2 VI (power), 3 VO (power)

## LT1083-3.3
designator *  value LT1083-3.3
ki_keywords: Voltage Regulator Fixed 7.5A Positive LDO; ki_description: 7.5A 20V LDO Linear Regulator, Fixed Output 3.3V, TO-220/TO-263; ki_fp_filters: TO?220* TO?263*; Supplier: https://www.analog.com/media/en/technical-documentation/data-sheets/1083ffe.pdf
pins: 1 GND (power), 2 VO (power), 3 VI (power)

## LT1083-3.6
designator *  value LT1083-3.6
ki_keywords: Voltage Regulator Fixed 7.5A Positive LDO; ki_description: 7.5A 20V LDO Linear Regulator, Fixed Output 3.6V, TO-220/TO-263; ki_fp_filters: TO?220* TO?263*; Supplier: https://www.analog.com/media/en/technical-documentation/data-sheets/1083ffe.pdf
pins: 1 GND (power), 2 VO (power), 3 VI (power)

## LT1083-5.0
designator *  value LT1083-5.0
ki_keywords: Voltage Regulator Fixed 7.5A Positive LDO; ki_description: 7.5A 20V LDO Linear Regulator, Fixed Output 5.V, TO-220/TO-263; ki_fp_filters: TO?220* TO?263*; Supplier: https://www.analog.com/media/en/technical-documentation/data-sheets/1083ffe.pdf
pins: 1 GND (power), 2 VO (power), 3 VI (power)

## LT1083-12
designator *  value LT1083-12
ki_keywords: Voltage Regulator Fixed 7.5A Positive LDO; ki_description: 7.5A 25V LDO Linear Regulator, Fixed Output 12V, TO-220/TO-263; ki_fp_filters: TO?220* TO?263*; Supplier: https://www.analog.com/media/en/technical-documentation/data-sheets/1083ffe.pdf
pins: 1 GND (power), 2 VO (power), 3 VI (power)

## LT1083-ADJ
designator *  value LT1083-ADJ
ki_keywords: Voltage Regulator Adjustable 7.5A Positive LDO; ki_description: 7.5A 25V LDO Linear Regulator, Adjustable Output, TO-220/TO-263; ki_fp_filters: TO?220* TO?263*; Supplier: https://www.analog.com/media/en/technical-documentation/data-sheets/108345fh.pdf
pins: 1 ADJ (in), 2 VO (power), 3 VI (power)

## LT1084-3.3
designator *  value LT1084-3.3
ki_keywords: Voltage Regulator Fixed 5.0A Positive LDO; ki_description: 5.0A 20V LDO Linear Regulator, Fixed Output 3.3V, TO-220/TO-263; ki_fp_filters: TO?220* TO?263*; Supplier: https://www.analog.com/media/en/technical-documentation/data-sheets/1083ffe.pdf
pins: 1 GND (power), 2 VO (power), 3 VI (power)

## LT1084-3.6
designator *  value LT1084-3.6
ki_keywords: Voltage Regulator Fixed 5.0A Positive LDO; ki_description: 5.0A 20V LDO Linear Regulator, Fixed Output 3.6V, TO-220/TO-263; ki_fp_filters: TO?220* TO?263*; Supplier: https://www.analog.com/media/en/technical-documentation/data-sheets/1083ffe.pdf
pins: 1 GND (power), 2 VO (power), 3 VI (power)

## LT1084-5.0
designator *  value LT1084-5.0
ki_keywords: Voltage Regulator Fixed 5.0A Positive LDO; ki_description: 5.0A 20V LDO Linear Regulator, Fixed Output 5.V, TO-220/TO-263; ki_fp_filters: TO?220* TO?263*; Supplier: https://www.analog.com/media/en/technical-documentation/data-sheets/1083ffe.pdf
pins: 1 GND (power), 2 VO (power), 3 VI (power)

## LT1084-12
designator *  value LT1084-12
ki_keywords: Voltage Regulator Fixed 5.0A Positive LDO; ki_description: 5.0A 25V LDO Linear Regulator, Fixed Output 12V, TO-220/TO-263; ki_fp_filters: TO?220* TO?263*; Supplier: https://www.analog.com/media/en/technical-documentation/data-sheets/1083ffe.pdf
pins: 1 GND (power), 2 VO (power), 3 VI (power)

## LT1084-ADJ
designator *  value LT1084-ADJ
ki_keywords: Voltage Regulator Adjustable 5.0A Positive LDO; ki_description: 5.0A 25V LDO Linear Regulator, Adjustable Output, TO-220/TO-263; ki_fp_filters: TO?220* TO?263*; Supplier: https://www.analog.com/media/en/technical-documentation/data-sheets/108345fh.pdf
pins: 1 ADJ (in), 2 VO (power), 3 VI (power)

## LT1085-3.3
designator *  value LT1085-3.3
ki_keywords: Voltage Regulator Fixed 3.0A Positive LDO; ki_description: 3.0A 20V LDO Linear Regulator, Fixed Output 3.3V, TO-220/TO-263; ki_fp_filters: TO?220* TO?263*; Supplier: https://www.analog.com/media/en/technical-documentation/data-sheets/1083ffe.pdf
pins: 1 GND (power), 2 VO (power), 3 VI (power)

## LT1085-3.6
designator *  value LT1085-3.6
ki_keywords: Voltage Regulator Fixed 3.0A Positive LDO; ki_description: 3.0A 20V LDO Linear Regulator, Fixed Output 3.6V, TO-220/TO-263; ki_fp_filters: TO?220* TO?263*; Supplier: https://www.analog.com/media/en/technical-documentation/data-sheets/1083ffe.pdf
pins: 1 GND (power), 2 VO (power), 3 VI (power)

## LT1085-5.0
designator *  value LT1085-5.0
ki_keywords: Voltage Regulator Fixed 3.0A Positive LDO; ki_description: 3.0A 20V LDO Linear Regulator, Fixed Output 5.V, TO-220/TO-263; ki_fp_filters: TO?220* TO?263*; Supplier: https://www.analog.com/media/en/technical-documentation/data-sheets/1083ffe.pdf
pins: 1 GND (power), 2 VO (power), 3 VI (power)

## LT1085-12
designator *  value LT1085-12
ki_keywords: Voltage Regulator Fixed 3.0A Positive LDO; ki_description: 3.0A 25V LDO Linear Regulator, Fixed Output 12V, TO-220/TO-263; ki_fp_filters: TO?220* TO?263*; Supplier: https://www.analog.com/media/en/technical-documentation/data-sheets/1083ffe.pdf
pins: 1 GND (power), 2 VO (power), 3 VI (power)

## LT1085-ADJ
designator *  value LT1085-ADJ
ki_keywords: Voltage Regulator Adjustable 3.0A Positive LDO; ki_description: 3.0A 25V LDO Linear Regulator, Adjustable Output, TO-220/TO-263; ki_fp_filters: TO?220* TO?263*; Supplier: https://www.analog.com/media/en/technical-documentation/data-sheets/108345fh.pdf
pins: 1 ADJ (in), 2 VO (power), 3 VI (power)

## LT1086-2.85
designator *  value LT1086-2.85
ki_keywords: Voltage Regulator Fixed 1.5A Positive LDO; ki_description: 1.5A 18V LDO Linear Regulator, Fixed Output 2.85V, TO-220/TO-263; ki_fp_filters: TO?220* TO?263*; Supplier: https://www.analog.com/media/en/technical-documentation/data-sheets/1086ffs.pdf
pins: 1 GND (power), 2 VO (power), 3 VI (power)

## LT1086-3.3
designator *  value LT1086-3.3
ki_keywords: Voltage Regulator Fixed 1.5A Positive LDO; ki_description: 1.5A 20V LDO Linear Regulator, Fixed Output 3.3V, TO-220/TO-263; ki_fp_filters: TO?220* TO?263*; Supplier: https://www.analog.com/media/en/technical-documentation/data-sheets/1086ffs.pdf
pins: 1 GND (power), 2 VO (power), 3 VI (power)

## LT1086-3.6
designator *  value LT1086-3.6
ki_keywords: Voltage Regulator Fixed 1.5A Positive LDO; ki_description: 1.5A 20V LDO Linear Regulator, Fixed Output 3.6V, TO-220/TO-263; ki_fp_filters: TO?220* TO?263*; Supplier: https://www.analog.com/media/en/technical-documentation/data-sheets/1086ffs.pdf
pins: 1 GND (power), 2 VO (power), 3 VI (power)

## LT1086-5.0
designator *  value LT1086-5.0
ki_keywords: Voltage Regulator Fixed 1.5A Positive LDO; ki_description: 1.5A 20V LDO Linear Regulator, Fixed Output 5.V, TO-220/TO-263; ki_fp_filters: TO?220* TO?263*; Supplier: https://www.analog.com/media/en/technical-documentation/data-sheets/1086ffs.pdf
pins: 1 GND (power), 2 VO (power), 3 VI (power)

## LT1086-12
designator *  value LT1086-12
ki_keywords: Voltage Regulator Fixed 1.5A Positive LDO; ki_description: 1.5A 25V LDO Linear Regulator, Fixed Output 12V, TO-220/TO-263; ki_fp_filters: TO?220* TO?263*; Supplier: https://www.analog.com/media/en/technical-documentation/data-sheets/1086ffs.pdf
pins: 1 GND (power), 2 VO (power), 3 VI (power)

## LT1086-ADJ
designator *  value LT1086-ADJ
ki_keywords: Voltage Regulator Adjustable 1.5A Positive LDO; ki_description: 1.5A 25V LDO Linear Regulator, Adjustable Output, TO-220/TO-263; ki_fp_filters: TO?220* TO?263*; Supplier: https://www.analog.com/media/en/technical-documentation/data-sheets/1086ffs.pdf
pins: 1 ADJ (in), 2 VO (power), 3 VI (power)
